# Altium footprint library PBL - THD Packages.PcbLib: 200 footprints (part 9 of 13)
Each footprint in its own frame and in the unit in brackets; x right, y up, seen from the top. Pads: shape width x height; smd on the part's side, far side on the other; paste and mask are expansions set on the pad; w line width, h text height; cw(c..) or ccw(c..) is an arc to the next point about the centre after c.
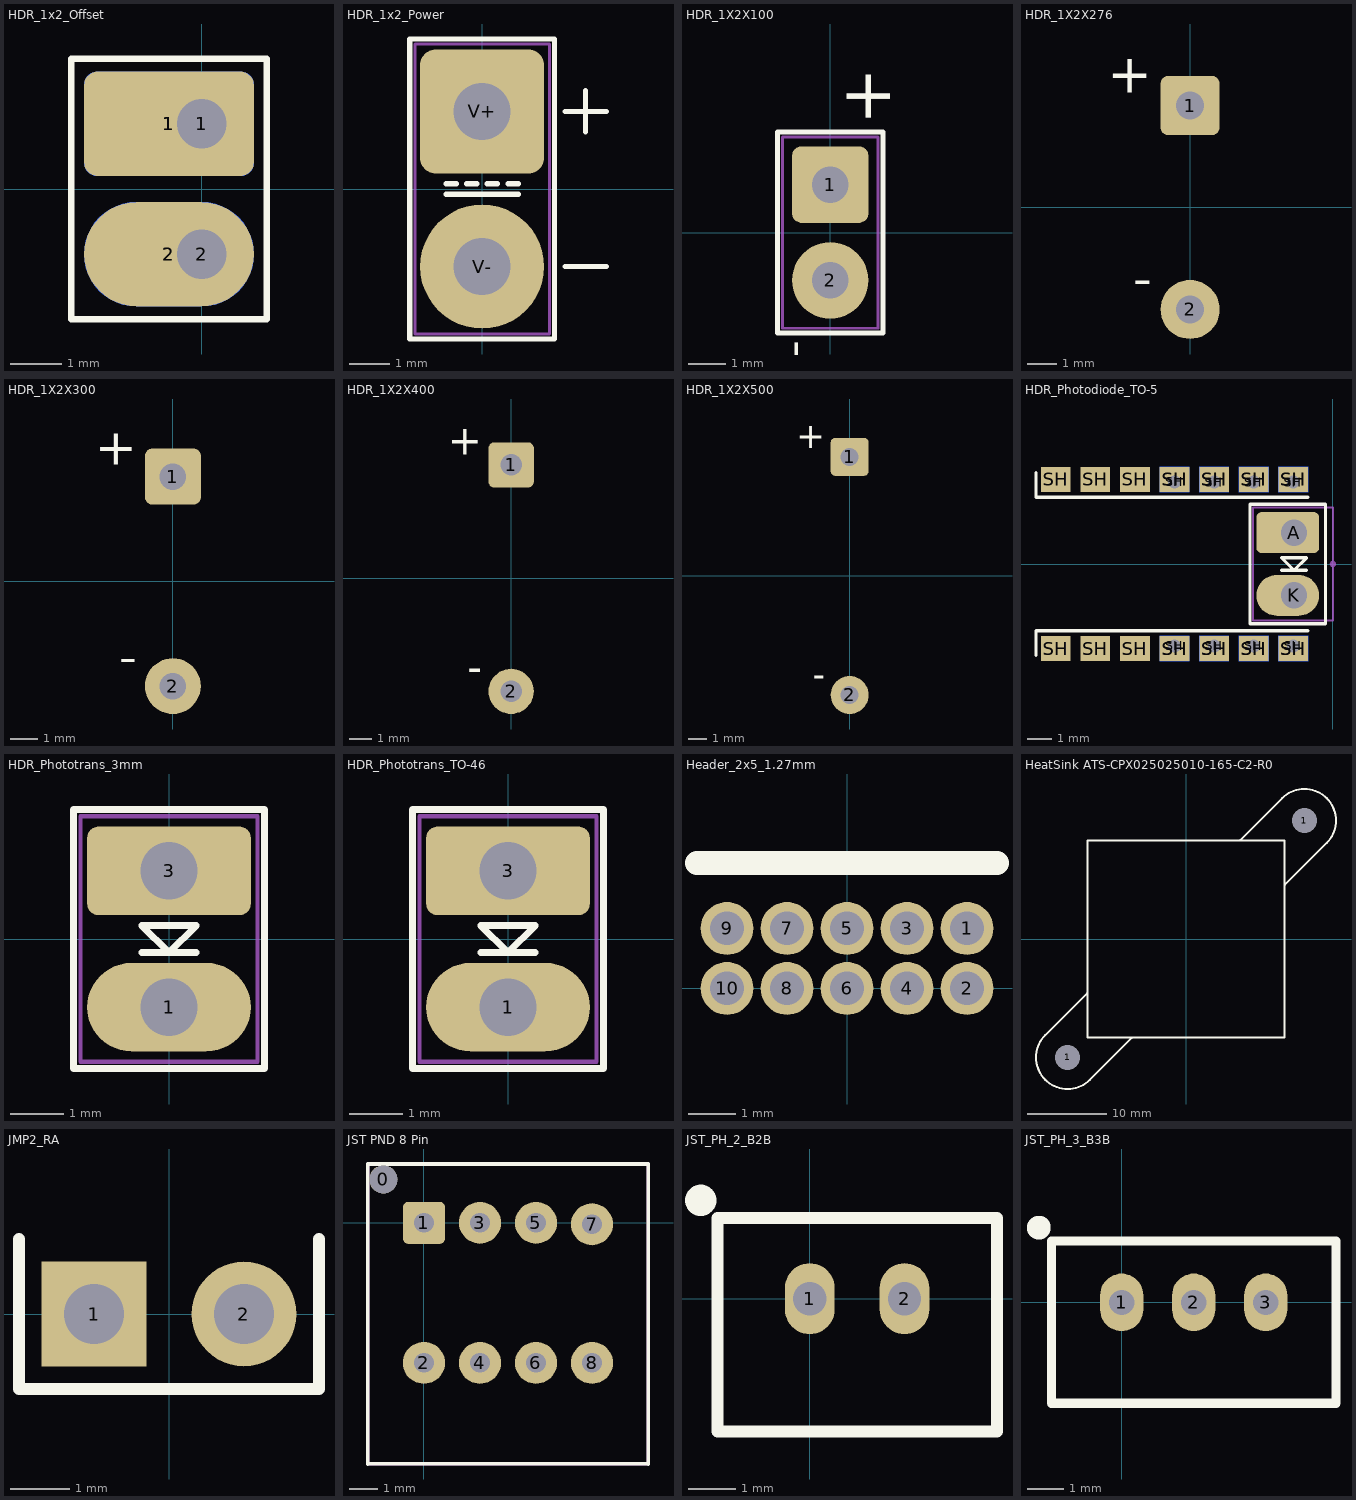
[diagram p8: the footprints below, top view; thin cyan lines are the x and y axes]

## HDR_1x2_Offset [mil]
pads (6):
  rrect25% 130x80 smd far side: 1(-25,50)
  rrect25% 130x80 smd: 1(-25,50)
  rrect25% 60x60 hole 38: 1(0,50)
  oval 130x80 smd far side: 2(-25,-50)
  oval 130x80 smd: 2(-25,-50)
  round 60 hole 38: 2(0,-50)
Top Overlay:
  lines w5: -100,-100 50,-100 50,100 -100,100 -100,-100

## HDR_1x2_Power [mil] "Connector Header, Single-row 2-position, 0.200\" pitch"
height 235
pads (2):
  rrect25% 120x120 hole 55: V+(0,75)
  round 120 hole 55: V-(0,-75)
Top Overlay:
  lines w5: -35,-5 35,-5 ; -35,5 -25,5 ; -15,5 -5,5 ; 5,5 15,5 ; 25,5 35,5 ; 80,-75 120,-75 ; 80,75 120,75 ; 100,55 100,95 ; -70,-145 -70,145 70,145 70,-145 -70,-145
13 - 3D Top Side:
  lines w3: -65,-140 -65,140 65,140 65,-140 -65,-140

## HDR_1X2X100 [mil]
pads (2):
  rrect25% 80x80 hole 38: 1(0,50)
  round 80 hole 38: 2(0,-50)
Top Overlay:
  lines w5: -55,-105 55,-105 55,105 -55,105 -55,-105
  text "-" at 0,-111.22 h90
  text "+" at 0,112.2 h90
13 - 3D Top Side:
  lines w3: -50,-100 50,-100 50,100 -50,100 -50,-100
3D body: height -3, standoff -5, extent -19.84,-19.96 20,19.96

## HDR_1X2X276 [mil]
pads (2):
  rrect25% 80x80 hole 38: 1(0,137.8)
  round 80 hole 38: 2(0,-137.8)
Top Overlay:
  text "+" at -51.18,137.8 h90
  text "-" at -51.18,-137.8 h90
Bottom Overlay:
  text "-" at -51.18,-137.8 h90
  text "+" at -51.18,137.8 h90
3D body: height -3, standoff -5, extent -19.84,117.84 20,157.76
3D body: height -3, standoff -5, extent -19.84,-157.75 20,-117.83

## HDR_1X2X300 [mil]
pads (2):
  rrect25% 80x80 hole 38: 1(0,150)
  round 80 hole 38: 2(0,-150)
Top Overlay:
  text "-" at -51.18,-149.61 h90
  text "+" at -51.18,149.61 h90
3D body: height -3, standoff -5, extent -19.84,130.04 20,169.96
3D body: height -3, standoff -5, extent -19.84,-169.96 20,-130.04

## HDR_1X2X400 [mil]
pads (2):
  rrect25% 80x80 hole 38: 1(0,200)
  round 80 hole 38: 2(0,-200)
Top Overlay:
  text "-" at -51.18,-200 h90
  text "+" at -51.18,200 h90
3D body: height -3, standoff -5, extent -19.84,180.04 20,219.96
3D body: height -3, standoff -5, extent -19.84,-219.96 20,-180.04

## HDR_1X2X500 [mil]
pads (2):
  rrect25% 80x80 hole 38: 1(0,250)
  round 80 hole 38: 2(0,-250)
Top Overlay:
  text "-" at -51.18,-250 h90
  text "+" at -51.18,250 h90
3D body: height 1.97, standoff 0, extent -39.68,-289.91 40.01,-210.07
3D body: height 1.97, standoff 0, extent -40,210 40,290

## HDR_Photodiode_TO-5 [mil] "Photodiode TO-5 form, edge straddling"
height 525
pads (33):
  round 10 on Mech15: 0(0,0)
  rrect25% 100x65 hole 42 copper offset -10,0: A(-61.81,50)
  oval 100x65 hole 42 copper offset -10,0: K(-61.81,-50)
  rect 47.24x40 smd: SH(-440.94,-134.49) SH(-440.94,134.5) SH(-377.95,-134.5) SH(-377.95,134.49) SH(-314.96,-134.5) SH(-314.96,134.49) SH(-251.97,-134.49) SH(-251.97,134.51) SH(-188.98,-134.49) SH(-188.98,134.5) SH(-125.99,-134.49) SH(-125.99,134.5) SH(-63,-134.49) SH(-63,134.5)
  rect 47.24x40 smd far side: SH(-251.97,-134.49) SH(-251.97,134.51) SH(-188.98,-134.49) SH(-188.98,134.5) SH(-125.99,-134.49) SH(-125.99,134.5) SH(-63,-134.49) SH(-63,134.5)
  round 32 hole 20: SH(-251.97,-130.49) SH(-251.97,130.51) SH(-188.98,-130.49) SH(-188.98,130.5) SH(-125.99,-130.49) SH(-125.99,130.5) SH(-63,-130.49) SH(-63,130.5)
Top Overlay:
  lines w5: -472.44,-145.66 -472.44,-106.29 -39.37,-106.29 ; -472.44,145.67 -472.44,106.3 -39.37,106.3 ; -81.81,-10 -41.81,-10 ; -131.81,-95 -11.81,-95 -11.81,95 -131.81,95 -131.81,-95 ; -81.81,10 -61.81,-10 -41.81,10 -81.81,10
13 - 3D Top Side:
  lines w3: -126.81,-90 0,-90 0,90 -126.81,90 -126.81,-90
3D body "TO-5 custom with shield.stp": height 109.1, standoff -172.1, extent -444.88,-140.32 86.62,140.32

## HDR_Phototrans_3mm [mil] "LED 3mm dia lens, 0.100\" pitch"
height 525
pads (2):
  oval 120x65 hole 42: 1(0,-50)
  rrect25% 120x65 hole 42: 3(0,50)
Top Overlay:
  lines w5: -20,-10 20,-10 ; -70,-95 -70,95 70,95 70,-95 -70,-95 ; -20,10 20,10 0,-10 -20,10
13 - 3D Top Side:
  lines w3: -65,-90 -65,90 65,90 65,-90 -65,-90
3D body "LED_3mm_T1.stp": height 31, standoff -94.49, extent -249.2,-62.86 516.54,62.87

## HDR_Phototrans_TO-46 [mil] "LED TO-46 form, edge straddling"
height 525
pads (2):
  oval 120x65 hole 42: 1(0,-50)
  rrect25% 120x65 hole 42: 3(0,50)
Top Overlay:
  lines w5: -20,-10 20,-10 ; -70,-95 -70,95 70,95 70,-95 -70,-95 ; -20,10 20,10 0,-10 -20,10
13 - 3D Top Side:
  lines w3: -65,-90 -65,90 65,90 65,-90 -65,-90
3D body "TO-46 Edge straddling.stp": height 77.29, standoff -150.51, extent -8.99,-119.01 546.86,108.79

## Header_2x5_1.27mm [mil] "10 Positions Header, Unshrouded Connector 0.050\" (1.27mm) Through Hole, Right Angle Gold"
height 134
pads (10):
  round 44 hole 28: 1(100,50) 2(100,0) 3(50,50) 4(50,0) 5(0,50) 6(0,0) 7(-50,50) 8(-50,0) 9(-100,50) 10(-100,0)
Top Overlay:
  lines w20: -125,104.33 125,104.33
Top Solder:
  rectangle: -117.13,-16.73 117.13,66.93
Bottom Solder:
  rectangle: -117.13,-16.73 117.13,66.93
3D body "_ _ _B052MWCN-RC.STEP": height 136.14, standoff -96.14, extent -125,-8.27 125,232.68

## HeatSink ATS-CPX025025010-165-C2-R0 [mil] "Heat Sink Assorted (BGA, LGA, CPU, ASIC...) Aluminum Top Mount"
pads (2):
  round 60 hole 125 unplated: 1(-590.55,-590.55) 1(590.55,590.55)
Top Overlay:
  lines w10: -492.13,-413.39 -492.13,-270.13 -492.84,-270.13 -701.91,-479.2 ccw(c-590.55,-590.55) -479.2,-701.91 -270,-492.71 -270,-492.13 ; 270,492.71 479.2,701.91 cw(c590.55,590.55) 701.91,479.2 492.84,270.13 ; -492.13,-492.13 -492.13,492.13 492.13,492.13 492.13,-492.13 -492.13,-492.13
3D body "ATS-CPX-165-CX-R0_FUSED.STEP": height 393.7, standoff 0, extent -747.81,-747.81 747.94,748.04

## JMP2_RA [mil] "2-pin RA jumper, 0.1\" .025 pins"
height 98.43
pads (2):
  rect 70x70 hole 40: 1(-50,0)
  round 70 hole 40: 2(50,0)
Top Overlay:
  lines w8: -100,50 -100,-50 100,-50 100,50
3D body "Hdr, 2-pin RA.step": height 98.43, standoff -129.94, extent -100,-12.5 100,393.7

## JST PND 8 Pin [mm] "Connector; Header; 6 Position 0.100\" pitch"
height 9.9
pads (9):
  round 1 hole 1: 0(-1.45,1.55)
  rrect25% 1.5x1.5 hole 0.7: 1(0,0)
  round 1.5 hole 0.7: 2(0,-5) 3(2,0) 4(2,-5) 5(4,0) 6(4,-5) 7(6,-0.051) 8(6,-5)
Top Overlay:
  lines w0.127: -2,-8.611 -2,2.1 8,2.1 ; -2,-8.6 8,-8.6 ; 8.001,-8.611 8.001,2.1
13 - 3D Top Side:
  lines w0.127: -2,-8.6 -2,2.1 8,2.1 8,-8.6 -2,-8.6
3D body "B08B-PNDZS-1.STEP": height 9.9, standoff -3.2, extent -2,-8.6 8,2.1

## JST_PH_2_B2B [mm]
height 6
pads (2):
  oval 1.05x1.5 hole 0.7: 1(0,0) 2(2,0)
Top Overlay:
  circle w0.5: c-2.3,2.075 r0.079
  lines w0.254: -1.95,-2.8 -1.95,1.7 3.95,1.7 3.95,-2.8 -1.95,-2.8
3D body "B2B-PH-K-S.STEP": height 6, standoff -3.4, extent -1.95,-2.8 3.95,1.7

## JST_PH_3_B3B [mm]
height 6
pads (3):
  oval 1.2x1.6 hole 0.7: 1(0,0) 2(2,0) 3(4,0)
Top Overlay:
  circle w0.5: c-2.3,2.075 r0.079
  lines w0.254: -1.95,-2.8 5.95,-2.8 5.95,1.7 -1.95,1.7 -1.95,-2.8
3D body "B3B-PH-K-S.STEP": height 6, standoff -3.4, extent -1.95,-2.8 5.95,1.7